# Altium footprint library PcbLib1.PcbLib: 62 footprints (part 3 of 4)
Each footprint in its own frame and in the unit in brackets; x right, y up, seen from the top. Pads: shape width x height; smd on the part's side, far side on the other; paste and mask are expansions set on the pad; w line width, h text height; cw(c..) or ccw(c..) is an arc to the next point about the centre after c.
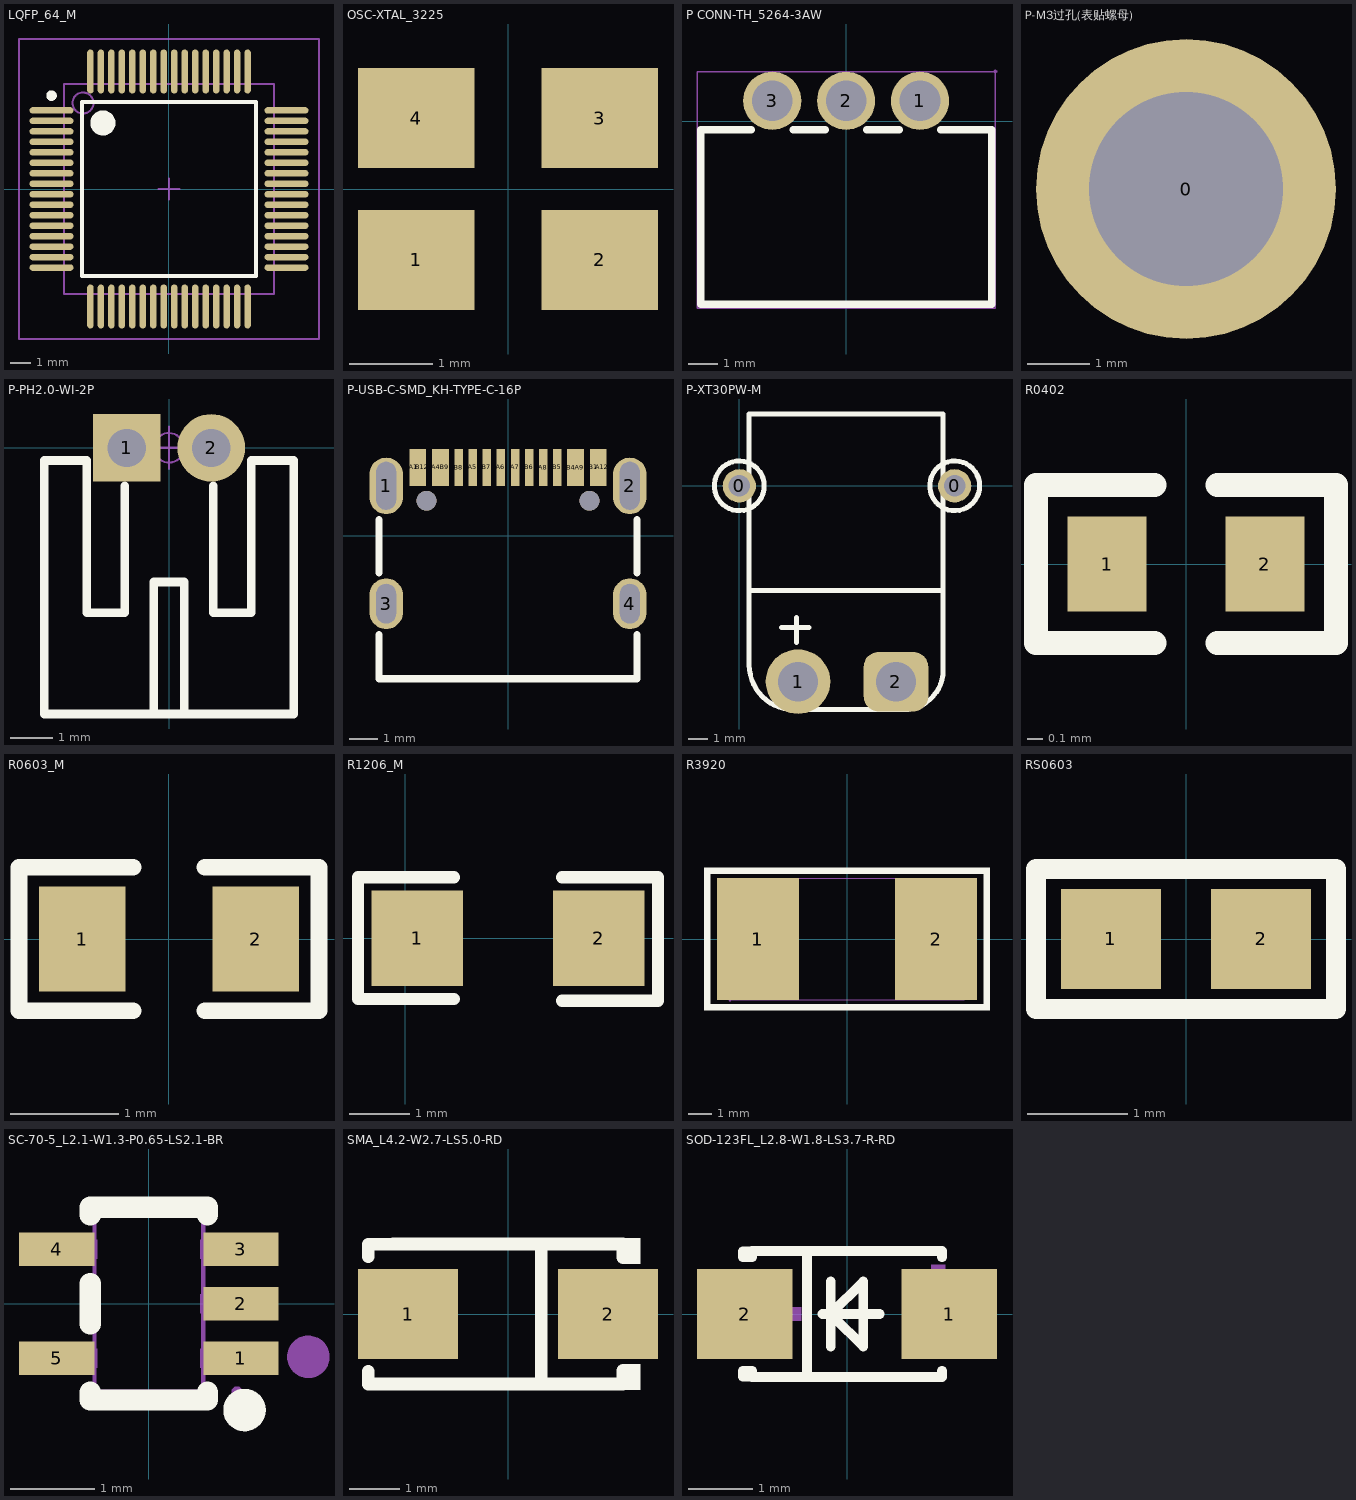
[diagram p2: the footprints below, top view; thin cyan lines are the x and y axes]

## LQFP_64_M [mm] "Thin QFP, 64-Leads, Body 10x10mm, Pitch 0.5mm, IPC Low Density"
height 1.6
pads (64):
  oval 2.1x0.3 smd: 1(-5.6,3.75) 2(-5.6,3.25) 3(-5.6,2.75) 4(-5.6,2.25) 5(-5.6,1.75) 6(-5.6,1.25) 7(-5.6,0.75) 8(-5.6,0.25) 9(-5.6,-0.25) 10(-5.6,-0.75) 11(-5.6,-1.25) 12(-5.6,-1.75) 13(-5.6,-2.25) 14(-5.6,-2.75) 15(-5.6,-3.25) 16(-5.6,-3.75) 33(5.6,-3.75) 34(5.6,-3.25) 35(5.6,-2.75) 36(5.6,-2.25) 37(5.6,-1.75) 38(5.6,-1.25) 39(5.6,-0.75) 40(5.6,-0.25) 41(5.6,0.25) 42(5.6,0.75) 43(5.6,1.25) 44(5.6,1.75) 45(5.6,2.25) 46(5.6,2.75) 47(5.6,3.25) 48(5.6,3.75)
  oval 0.3x2.1 smd: 17(-3.75,-5.6) 18(-3.25,-5.6) 19(-2.75,-5.6) 20(-2.25,-5.6) 21(-1.75,-5.6) 22(-1.25,-5.6) 23(-0.75,-5.6) 24(-0.25,-5.6) 25(0.25,-5.6) 26(0.75,-5.6) 27(1.25,-5.6) 28(1.75,-5.6) 29(2.25,-5.6) 30(2.75,-5.6) 31(3.25,-5.6) 32(3.75,-5.6) 49(3.75,5.6) 50(3.25,5.6) 51(2.75,5.6) 52(2.25,5.6) 53(1.75,5.6) 54(1.25,5.6) 55(0.75,5.6) 56(0.25,5.6) 57(-0.25,5.6) 58(-0.75,5.6) 59(-1.25,5.6) 60(-1.75,5.6) 61(-2.25,5.6) 62(-2.75,5.6) 63(-3.25,5.6) 64(-3.75,5.6)
Top Overlay:
  circle w0.6: c-3.15,3.15 r0.3
  circle w0.25: c-5.6,4.45 r0.125
  lines w0.2: -4.15,-4.15 4.15,-4.15 4.15,4.15 -4.15,4.15 -4.15,-4.15
Mechanical 13:
  circle w0.1: c-4.1,4.1 r0.5
  lines w0.1: -5,-5 5,-5 5,5 -5,5 -5,-5
Mechanical 15:
  lines w0.1: -0.5,0 0.5,0 ; 0,-0.5 0,0.5 ; -7.15,-7.15 7.15,-7.15 7.15,7.15 -7.15,7.15 -7.15,-7.15
3D body "User Library-STM32Fxxx -LQFP64 10mm x 10mm.STEP": height 1.6, standoff 0.01, extent -5.969,-6.029 6.029,5.969

## OSC-XTAL_3225 [mm]
pads (4):
  rect 1.4x1.2 smd: 1(-1.1,-0.85) 2(1.1,-0.85) 3(1.1,0.85) 4(-1.1,0.85)
3D body "晶阵.STEP": height 0.7, standoff 0, extent -1.6,-1.25 1.6,1.25

## P CONN-TH_5264-3AW [mm]
pads (3):
  round 2 hole 1.4 mask+0.051: 1(2.54,0.7) 2(0,0.7) 3(-2.54,0.7)
Top Overlay:
  lines w0.254: -3.256,-0.3 -5,-0.3 -5,-6.3 5,-6.3 ; -1.824,-0.3 -0.716,-0.3 ; 0.716,-0.3 1.824,-0.3 ; 3.256,-0.3 5,-0.3 ; 5.001,-6.301 5.001,-2.829 5.001,-0.301
Mechanical 15:
  region: 3.14,0.7 3.14,0.819 3.049,1.04 2.88,1.209 2.659,1.3 2.421,1.3 2.2,1.209 2.031,1.04 1.94,0.819 1.94,0.7 1.94,0.581 2.031,0.36 2.2,0.191 2.421,0.1 2.659,0.1 2.88,0.191 3.049,0.36 3.14,0.581 3.14,0.7
  region: 0.6,0.7 0.6,0.819 0.509,1.04 0.34,1.209 0.119,1.3 -0.119,1.3 -0.34,1.209 -0.509,1.04 -0.6,0.819 -0.6,0.7 -0.6,0.581 -0.509,0.36 -0.34,0.191 -0.119,0.1 0.119,0.1 0.34,0.191 0.509,0.36 0.6,0.581 0.6,0.7
  region: -1.94,0.7 -1.94,0.819 -2.031,1.04 -2.2,1.209 -2.421,1.3 -2.659,1.3 -2.88,1.209 -3.049,1.04 -3.14,0.819 -3.14,0.7 -3.14,0.581 -3.049,0.36 -2.88,0.191 -2.659,0.1 -2.421,0.1 -2.2,0.191 -2.031,0.36 -1.94,0.581 -1.94,0.7
  region: 5.188,1.7 5.188,1.725 5.153,1.76 5.103,1.76 5.068,1.725 5.068,1.7 5.068,1.675 5.103,1.64 5.153,1.64 5.188,1.675 5.188,1.7
  lines w0.051: -5.127,-6.428 5.128,-6.428 5.128,1.7 -5.127,1.7 -5.127,-6.428

## P-M3过孔(表贴螺母) [mm]
pads (1):
  round 4.842 hole 3.13: 0(-60.125,-18.046)

## P-PH2.0-WI-2P [mm] "长：5.9mm，宽：6mm，高：4.7mm"
height 10
pads (2):
  rect 1.6x1.6 hole 0.9: 1(-1,0)
  round 1.6 hole 0.9: 2(1,0)
Top Overlay:
  lines w0.203: -1.05,-0.9 -1.05,-3.9 -1.95,-3.9 -1.95,-3.3 -1.95,-0.3 -2,-0.3 -2.95,-0.3 -2.95,-6.3 2.95,-6.3 2.95,-0.3 2,-0.3 1.95,-0.3 1.95,-3.3 1.95,-3.9 1.05,-3.9 1.05,-0.9 ; -0.365,-6.215 -0.365,-3.175 0.365,-3.175 0.365,-6.215
Mechanical 15:
  circle w0.05: c0,0 r0.35
  lines w0.05: -0.5,0 0.5,0 ; 0,-0.5 0,0.5
3D body "PH2.0-WI-2P.STEP": height 4.75, standoff -2.65, extent -2.95,-6.3 2.95,0.3

## P-USB-C-SMD_KH-TYPE-C-16P [mm] "C709357"
pads (22):
  oval 1.2x2 hole 0.7 slot 1.7 at 90 deg: 1(-4.32,1.765) 2(4.32,1.765)
  oval 1.2x1.8 hole 0.7 slot 1.4 at 90 deg: 3(-4.32,-2.415) 4(4.32,-2.415)
  rect 0.3x1.3 smd: A1(-3.35,2.415) A4(-2.55,2.415) A5(-1.25,2.415) A6(-0.25,2.415) A7(0.25,2.415) A8(1.25,2.415) A9(2.55,2.415) A12(3.35,2.415) B1(3.05,2.415) B4(2.25,2.415) B5(1.75,2.415) B6(0.75,2.415) B7(-0.75,2.415) B8(-1.75,2.415) B9(-2.25,2.415) B12(-3.05,2.415)
  round 0.7 hole 0.7 unplated: ""(-2.89,1.235) ""(2.89,1.235)
Top Overlay:
  lines w0.254: -4.572,-3.507 -4.572,-5.08 4.572,-5.08 4.572,-3.507 ; -4.572,-1.323 -4.572,0.573 ; 4.572,-1.323 4.572,0.573
Top Paste:
  region: -3.45,3.01 -2.95,3.01 -2.95,1.82 -3.45,1.82
  region: 2.95,3.01 3.45,3.01 3.45,1.82 2.95,1.82
  region: 2.15,3.01 2.65,3.01 2.65,1.82 2.15,1.82
  region: -2.65,3.01 -2.15,3.01 -2.15,1.82 -2.65,1.82
  region: 1.6,3.06 1.9,3.06 1.9,1.77 1.6,1.77
  region: 0.1,3.06 0.4,3.06 0.4,1.77 0.1,1.77
  region: -0.4,3.06 -0.1,3.06 -0.1,1.77 -0.4,1.77
  region: -0.9,3.06 -0.6,3.06 -0.6,1.77 -0.9,1.77
  region: -1.9,3.06 -1.6,3.06 -1.6,1.77 -1.9,1.77
  region: 0.6,3.06 0.9,3.06 0.9,1.77 0.6,1.77
  region: 1.1,3.06 1.4,3.06 1.4,1.77 1.1,1.77
  region: -4.92,2.165 -4.92,2.284 -4.828,2.505 -4.66,2.674 -4.439,2.765 -4.2,2.765 -3.98,2.674 -3.811,2.505 -3.72,2.284 -3.72,2.165 -3.72,1.365 -3.72,1.245 -3.811,1.025 -3.98,0.856 -4.2,0.765 -4.439,0.765 -4.66,0.856 -4.828,1.025 -4.92,1.245 -4.92,1.365
  region: -4.92,-2.115 -4.92,-1.996 -4.828,-1.775 -4.66,-1.607 -4.439,-1.515 -4.2,-1.515 -3.98,-1.607 -3.811,-1.775 -3.72,-1.996 -3.72,-2.115 -3.72,-2.715 -3.72,-2.835 -3.811,-3.055 -3.98,-3.224 -4.2,-3.315 -4.439,-3.315 -4.66,-3.224 -4.828,-3.055 -4.92,-2.835 -4.92,-2.715
  region: 3.72,2.165 3.722,2.283 3.814,2.502 3.983,2.668 4.202,2.758 4.439,2.758 4.658,2.668 4.826,2.502 4.919,2.283 4.92,2.165 4.92,1.365 4.919,1.246 4.826,1.028 4.658,0.862 4.439,0.772 4.202,0.772 3.983,0.862 3.814,1.028 3.722,1.246 3.72,1.365
  region: 3.72,-2.115 3.722,-1.997 3.814,-1.779 3.983,-1.612 4.202,-1.522 4.439,-1.522 4.658,-1.612 4.826,-1.779 4.919,-1.997 4.92,-2.115 4.92,-2.715 4.919,-2.834 4.826,-3.052 4.658,-3.218 4.439,-3.309 4.202,-3.309 3.983,-3.218 3.814,-3.052 3.722,-2.834 3.72,-2.715
  region: -1.4,3.06 -1.1,3.06 -1.1,1.77 -1.4,1.77
Mechanical 15:
  circle w0.25: c-2.89,1.235 r0.125
  circle w0.25: c2.89,1.235 r0.125

## P-XT30PW-M [mm] "连接器"
pads (4):
  round 1.7 hole 1.1: 0(0,0) 0(11,0)
  round 3.302 hole 2.032: 1(3,-10)
  rrect50% 3.302x3.048 hole 2.032: 2(8,-10)
Top Overlay:
  circle w0.254: c0,0 r1.272
  circle w0.254: c11,0 r1.272
  lines w0.254: 2.159,-7.239 3.556,-7.239 ; 2.667,-11.43 8.382,-11.43 ccw(c8.382,-9.399) 10.413,-9.399 ; 2.794,-11.43 cw(c2.794,-9.144) 0.508,-9.144 0.508,-5.334 ; 2.921,-8.001 2.921,-6.731 ; 10.408,-9.399 10.408,-5.334 ; 0.508,-5.334 10.408,-5.334 ; 0.508,-5.334 0.508,3.666 10.408,3.666 10.408,2.915 10.408,-5.334
3D body "User Library-XT30- curved.STEP": height 5, standoff -2.1, extent -1.189,-11.295 12.111,3.711

## PCBComponent_1 [mm]

## R0402 [mm]
pads (2):
  rect 0.5x0.6 smd paste+0 mask+0.05: 1(-0.5,0) 2(0.5,0)
Top Overlay:
  lines w0.15: -0.2,-0.5 -0.95,-0.5 -0.95,0.5 -0.2,0.5 ; 0.2,-0.5 0.95,-0.5 0.95,0.5 0.2,0.5
3D body "0402.STEP": height 0.5, standoff 0, extent -0.5,-0.25 0.5,0.25

## R0603_M [mm]
pads (2):
  rect 0.8x0.965 smd: 1(-0.8,0) 2(0.8,0)
Top Overlay:
  lines w0.152: -0.33,-0.66 -1.384,-0.66 -1.384,0.66 -0.33,0.66 ; 0.33,-0.66 1.384,-0.66 1.384,0.66 0.33,0.66
3D body "RES0603.STEP": height 0.45, standoff 0, extent -0.812,-0.435 0.788,0.385

## R1206_M [mil]
pads (2):
  rect 60x62.99 smd: 1(8,0) 2(127,0)
Top Overlay:
  lines w8: 32,-40 -31,-40 -31,40 32,40 ; 103,-41 166,-41 166,40 103,40
3D body "R1206.STEP": height 23.62, standoff 0, extent 7.01,-31.49 133,31.5

## R3920 [mm]
pads (2):
  rect 3.5x5.2 smd: 1(-3.81,0) 2(3.81,0)
Top Overlay:
  region: 5.842,-3.048 -5.842,-3.048 -5.842,-2.794 5.842,-2.794
  region: 6.096,3.048 6.096,-3.048 5.842,-3.048 5.842,2.794
  region: -6.096,-3.048 -6.096,3.048 -5.842,3.048 6.096,3.048 6.096,2.794 -5.842,2.794 -5.842,-3.048
Mechanical 15:
  region: 5,-2.6 2.25,-2.6 2.25,2.6 5,2.6
  region: -5,2.6 -2.25,2.6 -2.25,-2.6 -5,-2.6
  region: -4.94,-2.6 -4.94,-2.575 -4.975,-2.54 -5.025,-2.54 -5.06,-2.575 -5.06,-2.6 -5.06,-2.625 -5.025,-2.66 -4.975,-2.66 -4.94,-2.625 -4.94,-2.6
  lines w0.051: -5,-2.6 -5,2.6 5,2.6 5,-2.6 -5,-2.6

## RS0603 [mm]
pads (2):
  rect 1x1 smd paste+0 mask+0.051: 1(-0.75,0) 2(0.75,0)
Top Overlay:
  lines w0.2: -1.5,-0.7 1.5,-0.7 1.5,0.7 -1.5,0.7 -1.5,-0.7

## SC-70-5_L2.1-W1.3-P0.65-LS2.1-BR [mm]
pads (5):
  rect 0.9x0.4 smd mask+0.051: 1(1.1,-0.65) 2(1.1,0) 3(1.1,0.65) 4(-1.1,0.65) 5(-1.1,-0.65)
Top Overlay:
  circle w0.254: c1.143,-1.27 r0.127
  lines w0.254: -0.7,-1.058 -0.7,-1.15 0.7,-1.15 0.7,-1.058 ; -0.7,-0.242 -0.7,0.242 ; -0.7,1.058 -0.7,1.15 0.7,1.15 0.7,1.058
Mechanical 6:
  circle w0.254: c1.905,-0.635 r0.127
Mechanical 15:
  region: -1.05,-0.763 -1.05,-0.538 -0.69,-0.538 -0.69,-0.763
  region: -0.7,-0.763 -0.7,-0.538 -0.615,-0.538 -0.615,-0.763
  region: -1.05,0.537 -1.05,0.762 -0.69,0.762 -0.69,0.537
  region: -0.7,0.537 -0.7,0.762 -0.615,0.762 -0.615,0.537
  region: 0.69,0.537 0.69,0.762 1.05,0.762 1.05,0.537
  region: 0.615,0.537 0.615,0.762 0.7,0.762 0.7,0.537
  region: 0.69,-0.113 0.69,0.112 1.05,0.112 1.05,-0.113
  region: 0.615,-0.113 0.615,0.112 0.7,0.112 0.7,-0.113
  region: 0.69,-0.763 0.69,-0.538 1.05,-0.538 1.05,-0.763
  region: 0.615,-0.763 0.615,-0.538 0.7,-0.538 0.7,-0.763
  region: 1.113,-1.052 1.113,-1.027 1.078,-0.992 1.028,-0.992 0.993,-1.027 0.993,-1.052 0.993,-1.077 1.028,-1.112 1.078,-1.112 1.113,-1.077 1.113,-1.052
  lines w0.051: -0.65,-1.05 0.65,-1.05 0.65,1.05 -0.65,1.05 -0.65,-1.05

## SMA_L4.2-W2.7-LS5.0-RD [mm]
pads (2):
  rect 2x1.8 smd: 1(-2,0) 2(2,0)
Top Overlay:
  region: 2.653,1.005 2.653,1.524 2.297,1.524 2.297,1.005
  region: 2.653,-1.523 2.653,-1.003 2.297,-1.003 2.297,-1.523
  lines w0.254: -2.794,-1.143 -2.794,-1.4 -2.3,-1.4 2.3,-1.4 2.3,-1.131 ; -2.794,1.143 -2.794,1.397 -2.54,1.397 -2.3,1.397 ; -2.3,1.4 2.3,1.4 2.3,1.131 ; 0.667,-1.4 0.667,1.4
Mechanical 15:
  region: -2.794,0.254 -2.794,-0.127 -1.27,-0.127 -1.27,0.254
  region: 1.397,0.254 1.397,-0.127 2.794,-0.127 2.794,0.254
  region: 1.905,-0.635 2.286,-0.635 2.286,0.762 1.905,0.762

## SOD-123FL_L2.8-W1.8-LS3.7-R-RD [mm]
pads (2):
  rect 1.48x1.4 smd: 1(1.59,0) 2(-1.59,0)
Top Overlay:
  lines w0.152: -0.621,-0.976 -0.621,0.976 ; -0.381,0 0.508,0 ; -0.254,-0.508 -0.254,0.508 ; -0.254,0 0.254,0.508 0.254,0.381 0.254,-0.508 -0.209,-0.045 -0.209,0 ; 1.476,-0.88 1.476,-0.976 -1.476,-0.976 ; 1.476,0.88 1.476,0.976 -1.476,0.976 ; -1.476,-0.976 -1.476,-0.88 -1.62,-0.88 -1.62,-0.976 -1.476,-0.976 ; -1.476,0.976 -1.476,0.88 -1.62,0.88 -1.62,0.976 -1.476,0.976
Mechanical 15:
  region: 1.524,0.762 1.524,-0.678 1.308,-0.678 1.308,0.762
  region: -1.575,0.108 -1.575,-0.108 -0.711,-0.108 -0.711,0.108
  region: 1.829,0.108 1.829,-0.108 0.965,-0.108 0.965,0.108
3D body "SOD-123.STEP": height 1.1, standoff -0.04, extent -1.85,-0.9 1.85,0.9